# Altium footprint library CD's_LIB_2018.PcbLib: 155 footprints (part 10 of 10)
Each footprint in its own frame and in the unit in brackets; x right, y up, seen from the top. Pads: shape width x height; smd on the part's side, far side on the other; paste and mask are expansions set on the pad; w line width, h text height; cw(c..) or ccw(c..) is an arc to the next point about the centre after c.
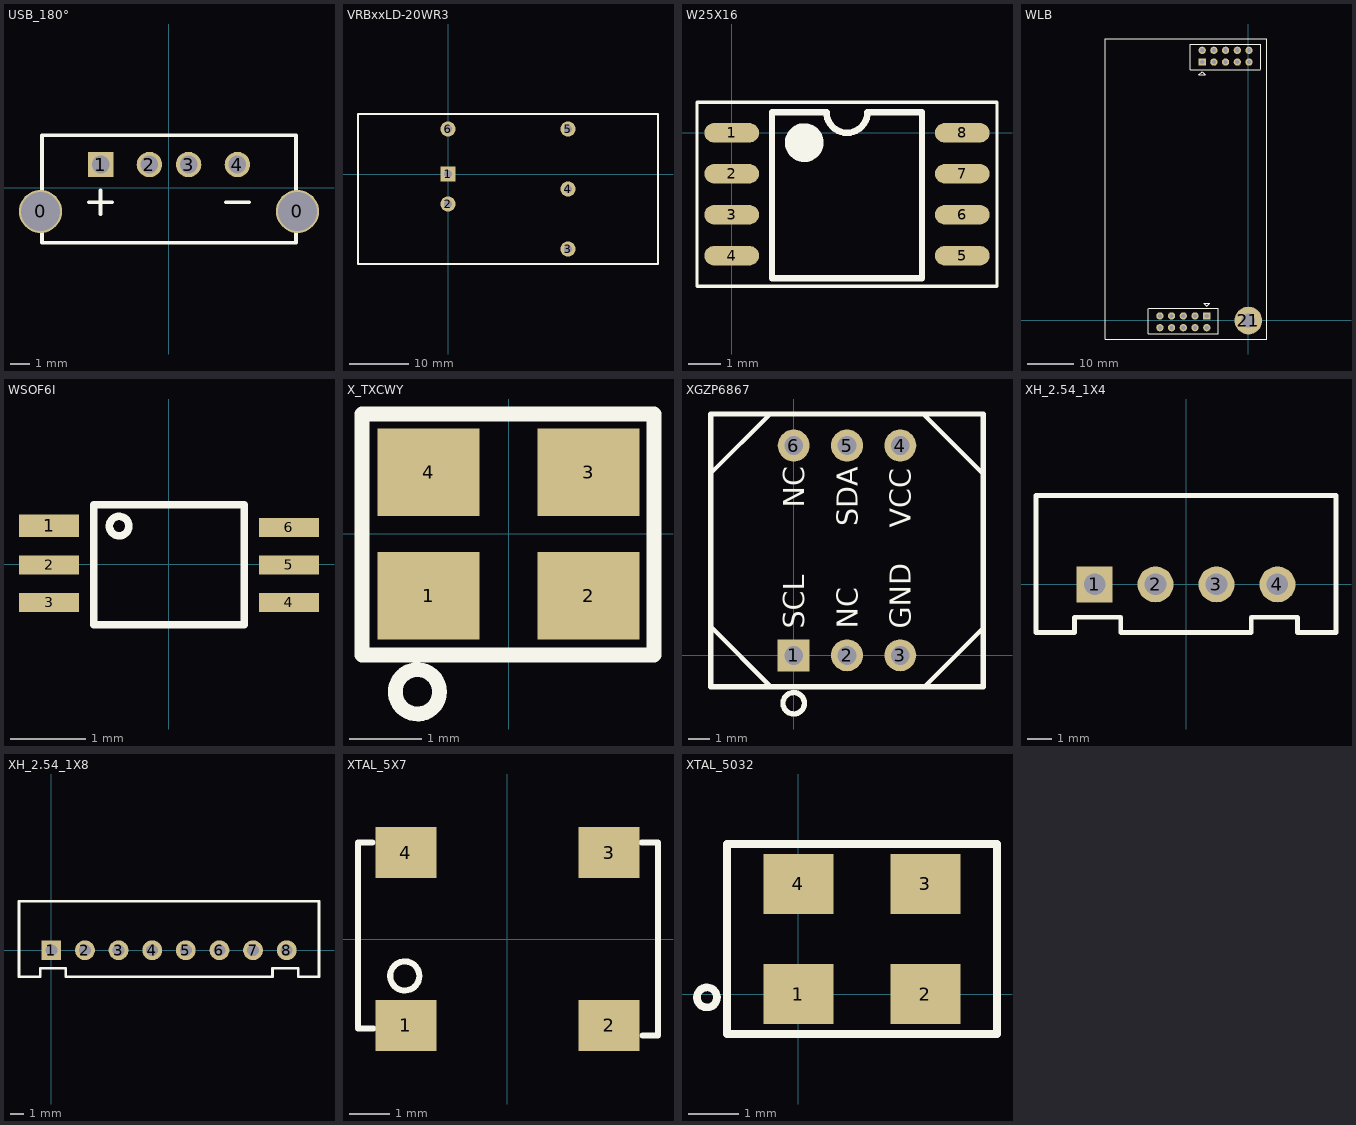
[diagram p9: the footprints below, top view; thin cyan lines are the x and y axes]

## USB_180° [mm] "直立USB"
pads (6):
  round 2.2 hole 2 unplated: 0(-6.57,-1.2) 0(6.57,-1.2)
  rect 1.3x1.3 hole 0.9 unplated: 1(-3.5,1.2)
  round 1.3 hole 0.9 unplated: 2(-1,1.2) 3(1,1.2) 4(3.5,1.2)
Top Overlay:
  lines w0.2: -4.097,-0.73 -2.903,-0.73 ; -3.5,-1.327 -3.5,-0.133 ; 2.903,-0.73 4.097,-0.73 ; -6.5,-2.801 6.5,-2.801 6.5,2.699 -6.5,2.699 -6.5,-2.801

## VRBxxLD-20WR3 [mm] "隔离DCDC模块"
pads (6):
  rect 2.6x2.6 hole 1.3: 1(0,0)
  round 2.6 hole 1.3: 2(0,-5.08) 3(20.32,-12.7) 4(20.32,-2.54) 5(20.32,7.62) 6(0,7.62)
Top Overlay:
  lines w0.3: -15.24,-15.24 35.56,-15.24 35.56,10.16 -15.24,10.16 -15.24,-15.24

## W25X16 [mm]
height 2.16
pads (8):
  oval 1.7x0.6 smd: 1(0,0) 2(0,-1.27) 3(0,-2.54) 4(0,-3.81) 5(7.15,-3.81) 6(7.15,-2.54) 7(7.15,-1.27) 8(7.15,0)
Top Overlay:
  circle w0.6: c2.25,-0.305 r0.3
  lines w0.1: -1.075,-4.755 8.225,-4.755 8.225,0.945 -1.075,0.945 -1.075,-4.755
  lines w0.2: 2.94,0.635 1.25,0.635 1.25,-4.505 5.9,-4.505 5.9,0.635 4.21,0.635
  lines w0.203: 2.94,0.635 ccw(c3.575,0.635) 3.575,0 ccw(c3.575,0.635) 4.21,0.635

## WLB [mil]
pads (21):
  rect 62x62 hole 36: 1(-393.64,2204.29) 11(-354.27,38.94)
  round 62 hole 36: 2(-393.64,2304.29) 3(-293.64,2204.29) 4(-293.64,2304.29) 5(-193.64,2204.29) 6(-193.64,2304.29) 7(-93.64,2204.29) 8(-93.64,2304.29) 9(6.36,2204.29) 10(6.36,2304.29) 12(-354.27,-61.06) 13(-454.27,38.94) 14(-454.27,-61.06) 15(-554.27,38.94) 16(-554.27,-61.06) 17(-654.27,38.94) 18(-654.27,-61.06) 19(-754.27,38.94) 20(-754.27,-61.06)
  round 236.22 hole 118.11: 21(0.06,-0.43)
Top Overlay:
  lines w7: -852.27,100.94 -852.27,-115.06 -254.27,-115.06 -254.27,102.94 -304.27,102.94 -850.27,102.94 ; 102.36,2140.29 -443.64,2140.29 -493.64,2140.29 -493.64,2358.29 104.36,2358.29 104.36,2142.29 ; -420.64,2094.29 -393.64,2121.29 -366.64,2094.29 -375.64,2094.29 -420.64,2094.29 ; -381.27,148.94 -354.27,121.94 -327.27,148.94 -372.27,148.94 -381.27,148.94
  lines w10: -1220.41,-157.91 -1220.41,2401.14 157.54,2401.14 157.54,-157.91 -1220.41,-157.91

## WSOF6I [mm]
pads (6):
  rect 0.8x0.3 smd: 1(-1.6,0.513)
  rect 0.8x0.25 smd: 2(-1.6,-0.012) 3(-1.6,-0.512) 4(1.6,-0.512) 5(1.6,-0.012) 6(1.6,0.487)
Top Overlay:
  circle w0.1: c-0.665,0.506 r0.13
  lines w0.1: -1,-0.813 1,-0.813 1,0.788 -1,0.788 -1,-0.813

## X_TXCWY [mm]
pads (4):
  rect 1.4x1.2 smd: 1(-1.1,-0.85) 2(1.1,-0.85) 3(1.1,0.85) 4(-1.1,0.85)
Top Overlay:
  circle w0.203: c-1.252,-2.171 r0.305
  lines w0.203: -2.014,-1.663 -2.014,1.65 2,1.65 2,-1.663 -2.014,-1.663
3D body: height 0.72, standoff 0, extent -1.6,-1.275 1.6,1.225

## XGZP6867 [mil] "压力传感器"
pads (6):
  rect 60x60 hole 35.43: 1(0,0)
  round 60 hole 35.43: 2(100,0) 3(200,0) 4(200,393.7) 5(100,393.7) 6(0,393.7)
Top Overlay:
  circle w10: c0,-90 r20.12
  lines w7.87: -154.91,341.85 -44,452.76 ; -153.91,51.85 -43,-59.06 ; 243,452.85 353.91,341.94 ; 245,-59.15 355.91,51.76
  lines w10: -155.91,-59.06 355.91,-59.06 355.91,452.76 -155.91,452.76 -155.91,-59.06
  text "GND" at 220,50 h39.37
  text "VCC" at 220,239.7 h39.37
  text "SDA" at 120,241.95 h39.37
  text "NC" at 120,50 h39.37
  text "NC" at 20,276.81 h39.37
  text "SCL" at 20,50 h39.37

## XH_2.54_1X4 [mm] "白色防反接"
pads (4):
  rect 1.5x1.5 hole 0.9: 1(-3.81,0)
  round 1.5 hole 0.9: 2(-1.27,0) 3(1.27,0) 4(3.81,0)
Top Overlay:
  lines w0.2: -6.25,-2 -6.25,3.7 6.25,3.7 6.25,-2 4.648,-2 4.648,-1.372 2.718,-1.372 2.718,-2 -2.718,-2 -2.718,-1.372 -4.648,-1.372 -4.648,-2 -6.25,-2

## XH_2.54_1X8 [mm] "白色防反接"
pads (8):
  rect 1.5x1.5 hole 0.9: 1(0,0)
  round 1.5 hole 0.9: 2(2.54,0) 3(5.08,0) 4(7.62,0) 5(10.16,0) 6(12.7,0) 7(15.24,0) 8(17.78,0)
Top Overlay:
  lines w0.2: -2.44,-2 -2.44,3.7 20.22,3.7 20.22,-2 18.644,-2 18.644,-1.372 16.713,-1.372 16.713,-2 1.092,-2 1.092,-1.372 -0.838,-1.372 -0.838,-2 -2.44,-2

## XTAL_5X7 [mil]
pads (4):
  rect 60x50 smd: 1(-100,-85) 2(100,-85) 3(100,85) 4(-100,85)
Top Overlay:
  circle w6: c-101,-36.32 r14.32
  lines w6: -133,95 -147,95 -147,-88 -132,-88 ; 132,95 148,95 148,-95 133,-95

## XTAL_5032 [mm]
pads (4):
  rect 1.4x1.2 smd: 1(0,0) 2(2.54,0) 3(2.54,2.2) 4(0,2.2)
Top Overlay:
  circle w0.152: c-1.829,-0.068 r0.2
  lines w0.152: -1.43,-0.8 -1.43,3 3.97,3 3.97,-0.8 -1.43,-0.8